# Altium footprint library Custom_Library.PcbLib: 221 footprints (part 5 of 14)
Each footprint in its own frame and in the unit in brackets; x right, y up, seen from the top. Pads: shape width x height; smd on the part's side, far side on the other; paste and mask are expansions set on the pad; w line width, h text height; cw(c..) or ccw(c..) is an arc to the next point about the centre after c.
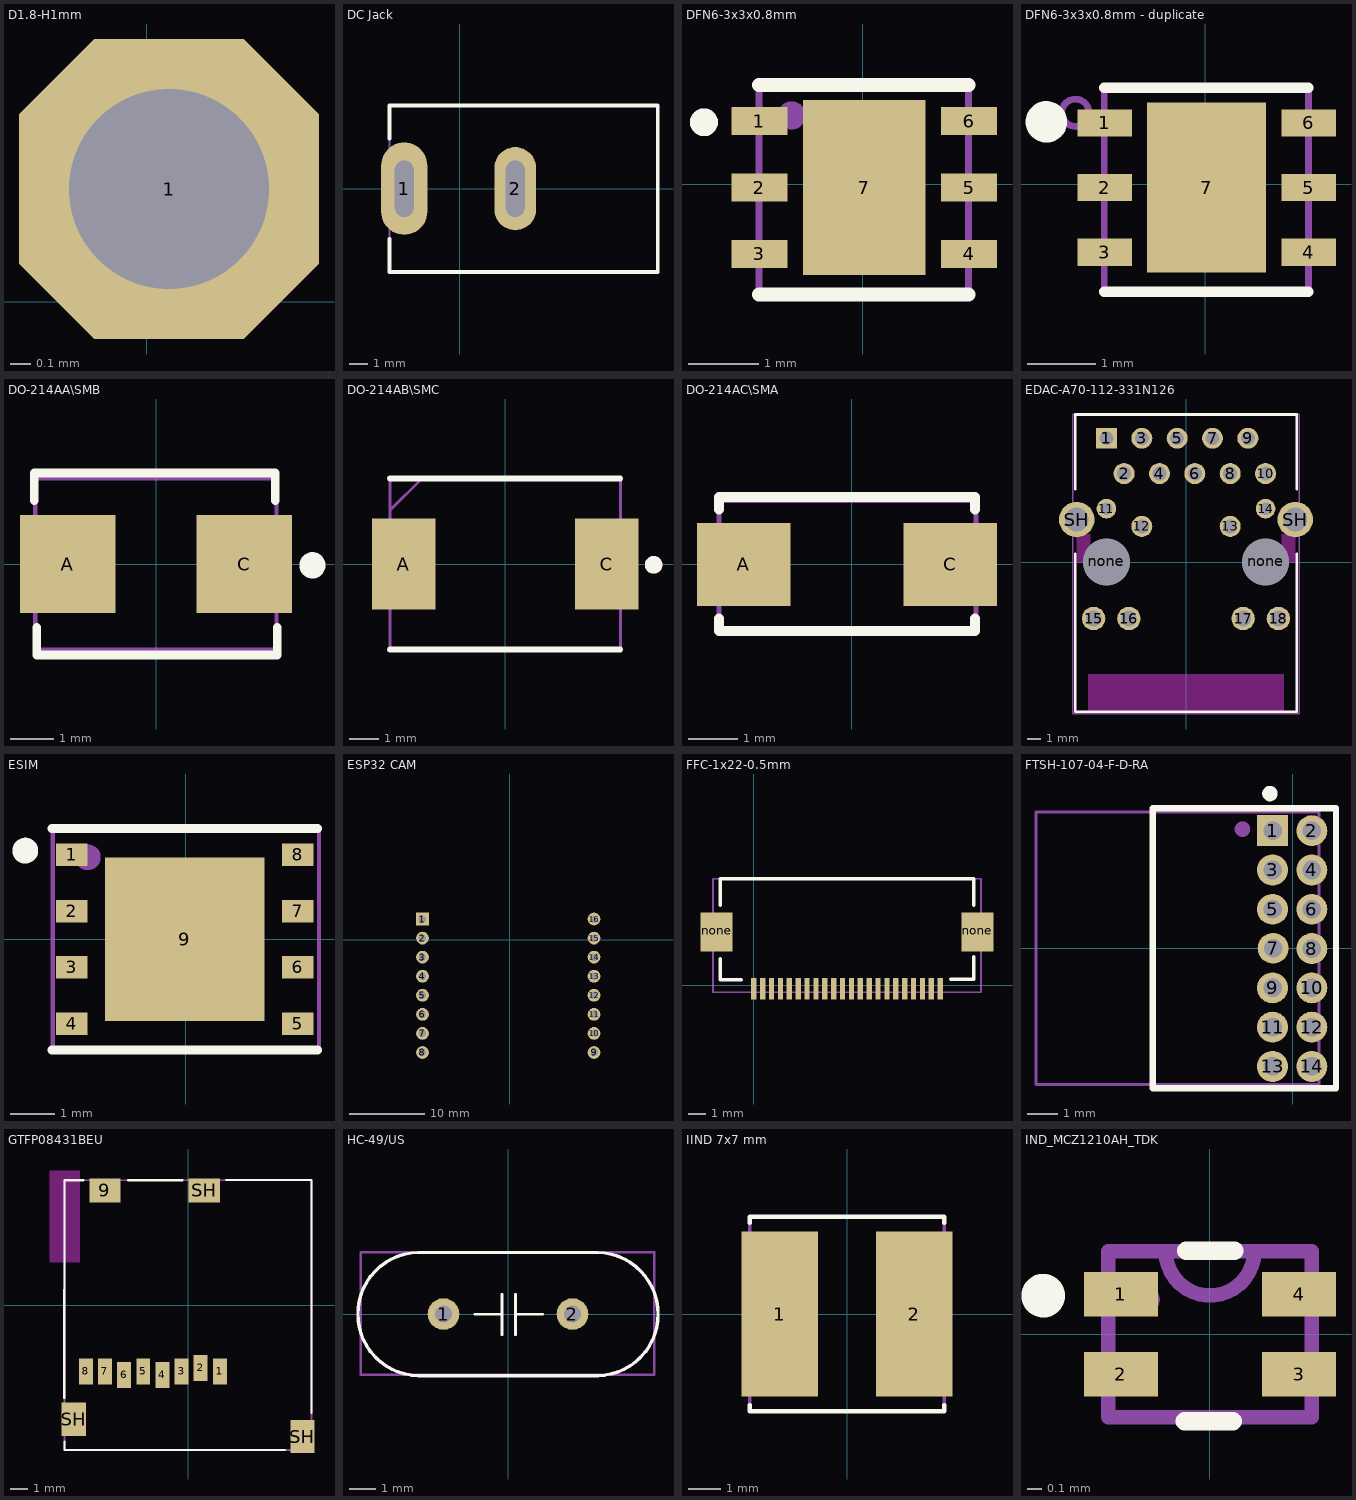
[diagram p4: the footprints below, top view; thin cyan lines are the x and y axes]

## D1.8-H1mm [mm]
height 1.3
pads (1):
  oct 1.5x1.5 hole 1 mask+0.1: 1(0.112,0.564)

## DC Jack [mm]
pads (2):
  oval 2.5x5 hole 1.016 slot 3.048 at 90 deg: 1(-3,0)
  oval 2.25x4.5 hole 1.016 slot 3.048 at 90 deg: 2(3,0)
Top Overlay:
  lines w0.2: -3.8,-2.7 -3.8,-4.5 10.7,-4.5 10.7,4.5 -3.8,4.5 -3.8,2.7
Top Assembly:
  lines w0.1: -3.8,-4.535 10.72,-4.535 10.72,4.5 -3.7,4.5 -3.8,4.5 -3.8,-4.535
  text "'.Designator'" at -0.885,-6.541 h1.27
3D body "PJ-037AH--3DModel-STEP-56544.STEP": height 11.1, standoff -3.4, extent -3.796,-4.51 10.704,4.49

## DFN6-3x3x0.8mm [mil]
pads (7):
  rect 31.5x15.75 smd mask+1.97: 1(-58.27,35.43) 2(-58.27,-1.97) 3(-58.27,-39.37) 4(59.85,-39.37) 5(59.85,-1.97) 6(59.85,35.43)
  rect 68.9x98.43 smd mask+1.97: 7(0.79,-1.97)
Top Overlay:
  circle w7.87: c-89.42,34.8 r3.94
  lines w7.87: -58.5,-62.24 59.61,-62.24 ; -58.5,55.87 59.61,55.87
Top Assembly:
  circle w7.87: c-40,38.7 r3.94
  lines w3.94: -58.5,56.26 -58.5,-61.85 ; 59.61,56.26 59.61,-61.85 ; -58.5,-61.85 -58.5,56.69 59.61,56.69 59.61,-61.85 ; -58.5,-61.85 59.61,-61.85
  text "'.Designator'" at -145.36,-112.32 h59.06
3D body "User Library-DFN6.STEP": height -16.46, standoff -47.95, extent -58.26,-61.02 59.85,57.08

## DFN6-3x3x0.8mm - duplicate [mil]
pads (7):
  rect 31.5x15.75 smd mask+1.97: 1(-58.27,35.43) 2(-58.27,-1.97) 3(-58.27,-39.37) 4(59.85,-39.37) 5(59.85,-1.97) 6(59.85,35.43)
  rect 68.9x98.43 smd mask+1.97: 7(0.79,-1.97)
Top Overlay:
  circle w12: c-91.99,36.08 r6
  lines w5.91: -58.5,-62.24 59.61,-62.24 ; -58.5,55.87 59.61,55.87
Top Assembly:
  circle w3.94: c-75.2,41.34 r7.87
  lines w3.94: -58.5,56.26 -58.5,-61.85 ; 59.61,56.26 59.61,-61.85 ; -58.5,-61.85 -58.5,56.69 59.61,56.69 59.61,-61.85 ; -58.5,-61.85 59.61,-61.85
  text "'.Designator'" at 28.47,12.06 h59.06
3D body "User Library-DFN6.STEP": height -16.46, standoff -47.95, extent -58.26,-61.03 59.85,57.08

## DO-214AA\SMB [mil]
pads (2):
  rect 87x89 smd paste+0: A(-80.5,0) C(80.5,0)
Top Overlay:
  circle w12: c142.61,-1.22 r6
  lines w7.87: -111.03,57.6 -111.03,83 108.84,83 108.84,57.6 ; -108.84,-57.6 -108.84,-83 110.48,-83 110.48,-57.6
Top Assembly:
  lines w3.94: -110.13,-78.06 109.84,-78.06 109.84,78.12 -110.13,78.12 -110.13,-78.06
  text "'.Designator'" at -140.17,-127.68 h50
3D body "SMB_STM.step": height 121.81, standoff -1.78, extent -110,-78 110,77.99

## DO-214AB\SMC [mm]
pads (2):
  rect 2.2x3.15 smd: A(-3.5,0) C(3.5,0)
Top Overlay:
  circle w0.305: c5.116,-0.029 r0.152
  lines w0.2: -3.97,-2.952 3.97,-2.952 ; -3.97,2.952 3.97,2.952
Top Assembly:
  text "'.Designator'" at -0.213,0.508 h1.27
Mechanical 15:
  lines w0.1: -3.97,1.852 -2.87,2.952 ; -3.97,-2.952 -3.97,2.952 3.97,2.952 3.97,-2.952 -3.97,-2.952
3D body "SMLJ60S6-TP.stp": height -0.83, standoff -3.33, extent -3.976,-3.073 4.024,3.027

## DO-214AC\SMA [mm]
pads (2):
  rect 1.9x1.69 smd: A(-2.195,0) C(1.995,0)
Top Overlay:
  lines w0.2: -2.7,-1.1 -2.7,-1.351 2.5,-1.351 2.5,-1.1 ; -2.698,1.119 -2.698,1.371 2.502,1.371 2.502,1.119
Top Assembly:
  lines w0.1: -2.7,-1.3 -2.7,1.3 2.522,1.3 2.522,-1.3 -2.7,-1.3
  text "'.Designator'" at -3.298,-2.833 h1.27
3D body "SMA.step": height 2.2, standoff 0, extent -2.697,-1.303 2.497,1.303

## EDAC-A70-112-331N126 [mm]
pads (22):
  rect 1.508x1.508 hole 1: 1(-5.715,8.89)
  round 1.508 hole 1: 2(-4.445,6.35) 3(-3.175,8.89) 4(-1.905,6.35) 5(-0.635,8.89) 6(0.635,6.35) 7(1.905,8.89) 8(3.175,6.35) 9(4.445,8.89) 10(5.715,6.35) 12(-3.175,2.56) 13(3.175,2.56)
  round 1.408 hole 0.9: 11(-5.715,3.83) 14(5.715,3.83)
  round 1.68 hole 1.12: 15(-6.64,-4.06) 16(-4.1,-4.06) 17(4.1,-4.06) 18(6.64,-4.06)
  round 3.35 hole 3.35 unplated: none(-5.715,0) none(5.715,0)
  round 2.55 hole 1.7: SH(-7.85,3.05) SH(7.85,3.05)
Top Overlay:
  lines w0.2: -7.95,0.6 -7.95,-10.75 7.95,-10.75 7.95,0.6 ; -7.95,5.25 -7.95,10.6 7.95,10.6 7.95,5.25
Keep-Out Layer:
  region: 7.005,-10.75 -7.005,-10.75 -7.005,-8.05 7.005,-8.05
  region: 7.005,-10.75 -7.005,-10.75 -7.005,-8.05 7.005,-8.05
  region: 7.85,0 6.875,0 6.875,2 7.85,2
  region: 7.85,0 6.875,0 6.875,2 7.85,2
  region: -6.875,0 -7.85,0 -7.85,2 -6.875,2
  region: -6.875,0 -7.85,0 -7.85,2 -6.875,2
Top Assembly:
  lines w0.1: -8.138,-10.918 -8.138,10.4 -8.138,10.632 8.12,10.632 8.12,-10.918 -8.138,-10.918
  text "'.Designator'" at -3.714,-7.772 h1.27
3D body "A70-112-331N126--3DModel-STEP-56544.STEP": height 13.65, standoff -3.3, extent -8.116,-10.906 8.084,10.594

## ESIM [mm]
pads (9):
  rect 0.71x0.51 smd: 1(-2.576,1.901) 2(-2.576,0.631) 3(-2.576,-0.639) 4(-2.576,-1.909) 5(2.524,-1.909) 6(2.524,-0.639) 7(2.524,0.631) 8(2.524,1.901)
  rect 3.6x3.7 smd paste-3: 9(-0.026,-0.004)
Top Overlay:
  circle w0.3: c-3.626,1.996 r0.141
  lines w0.2: -3.026,-2.504 2.974,-2.504 ; -3.026,2.496 2.974,2.496
Top Paste:
  region: 1.474,-1.454 0.154,-1.454 0.154,-0.184 1.474,-0.184
  region: -0.206,-1.454 -1.526,-1.454 -1.526,-0.184 -0.206,-0.184
  region: 1.474,0.176 0.154,0.176 0.154,1.446 1.474,1.446
  region: -0.206,0.176 -1.526,0.176 -1.526,1.446 -0.206,1.446
Top Assembly:
  circle w0.3: c-2.216,1.846 r0.141
  lines w0.1: -3.001,-2.511 3.004,-2.511 3.004,1.383 3.004,2.513 -3.001,2.513 -3.001,-2.511
  text "'.Designator'" at -5.023,-4.444 h2
3D body "SIM-ST-MFF2--3DModel-STEP-56544.STEP": height 0.82, standoff 0, extent -3,-2.5 3,2.5

## ESP32 CAM [mm]
pads (16):
  rect 1.7x1.7 hole 1 mask+0.05: 1(-11.623,2.78)
  round 1.7 hole 1 mask+0.05: 2(-11.623,0.24) 3(-11.623,-2.3) 4(-11.623,-4.84) 5(-11.623,-7.38) 6(-11.623,-9.92) 7(-11.623,-12.46) 8(-11.623,-15) 9(11.237,-15) 10(11.237,-12.46) 11(11.237,-9.92) 12(11.237,-7.38) 13(11.237,-4.84) 14(11.237,-2.3) 15(11.237,0.24) 16(11.237,2.78)
Bottom Overlay:
  circle w0.2: c-13.972,2.975 r0.1
  lines w0.127: -13.605,-19.867 -13.605,20.107 13.617,20.107 13.617,-19.867 -13.605,-19.867
3D body "esp32cam.STEP": height 5.05, standoff -12.15, extent -13.6,-19.878 13.6,20.122

## FFC-1x22-0.5mm [mm]
pads (24):
  rect 0.3x1.2 smd: 1(0,-0.2) 2(0.5,-0.2) 3(1,-0.2) 4(1.5,-0.2) 5(2,-0.2) 6(2.5,-0.2) 7(3,-0.2) 8(3.5,-0.2) 9(4,-0.2) 10(4.5,-0.2) 11(5,-0.2) 12(5.5,-0.2) 13(6,-0.2) 14(6.5,-0.2) 15(7,-0.2) 16(7.5,-0.2) 17(8,-0.2) 18(8.5,-0.2) 19(9,-0.2) 20(9.5,-0.2) 21(10,-0.2) 22(10.5,-0.2)
  rect 1.8x2.2 smd: none(-2.1,3) none(12.6,3)
Top Overlay:
  lines w0.2: -1.9,1.5 -1.9,0.3 -0.7,0.3 ; -1.9,4.5 -1.9,6 12.4,6 12.4,4.5 ; 11.1,0.34 12.4,0.34 12.4,1.6
Top Assembly:
  lines w0.1: -2.3,-0.4 12.8,-0.4 12.8,6 -1.1,6 -2.3,6 -2.3,-0.4
  text "'.Designator'" at 0.03,2.234 h2
3D body "FH12-22S-0.5SH.STEP": height -0.44, standoff -2.54, extent -2.291,-0.401 12.809,5.999

## FTSH-107-04-F-D-RA [mm] "1.27mm pitch, 14 pin, interconnect strip; double row"
height 3.05
pads (14):
  rect 1x1 / inner round 1 / far side rect 1x1 hole 0.6: 1(-0.655,3.8)
  round 1 hole 0.6: 2(0.615,3.8) 3(-0.655,2.53) 4(0.615,2.53) 5(-0.655,1.26) 6(0.615,1.26) 7(-0.635,0) 8(0.615,-0.01) 9(-0.655,-1.28) 10(0.615,-1.28) 11(-0.655,-2.55) 12(0.615,-2.55) 13(-0.655,-3.82) 14(0.615,-3.82)
Top Overlay:
  circle w0.25: c-0.74,5 r0.125
  lines w0.2: -4.527,-4.527 -4.527,4.527 1.396,4.527 1.396,-4.527 -4.527,-4.527
Top Assembly:
  circle w0.25: c-1.628,3.85 r0.125
  lines w0.1: -8.3,-4.4 -5.6,-4.4 0.848,-4.4 0.848,-3.047 0.848,4.4 -8.3,4.4 -8.3,-4.4
  text "'.Designator'" at -7.135,-5.813 h1.27
3D body "FTSH-107-04-F-D-RA.STEP": height 3.61, standoff -2.1, extent -8.253,-4.408 0.815,4.405

## GTFP08431BEU [mm]
pads (12):
  rect 0.8x1.5 smd: 1(1.8,-3.8) 2(0.7,-3.6) 3(-0.4,-3.8) 4(-1.5,-4) 5(-2.6,-3.8) 6(-3.7,-4) 7(-4.8,-3.8) 8(-5.9,-3.8)
  rect 1.8x1.4 smd: 9(-4.8,6.6) SH(0.9,6.6)
  rect 1.4x1.9 smd: SH(-6.6,-6.55) SH(6.55,-7.55)
Top Layer keep-out:
  region: -6.222,2.459 -6.222,7.742 -7.975,7.742 -7.975,2.459
Top Overlay:
  lines w0.127: -7.139,-5.325 -7.132,7.182 -6.032,7.182 ; -7.132,-7.838 -7.132,-8.318 -7.125,-8.318 5.536,-8.318 ; -3.473,7.182 -0.363,7.182 ; 2.168,7.196 7.065,7.196 7.065,-6.175
Top Assembly:
  lines w0.1: -7.132,-8.318 7.068,-8.318 7.068,7.182 -6.032,7.182 -7.132,7.182 -7.132,-8.318
  text "'.Designator'" at -4.038,-0.893 h1.5
3D body "DM3CS-SF.STEP": height 1.98, standoff 0.05, extent -6.932,-7.318 6.868,6.782

## HC-49/US [mm]
pads (2):
  round 1.2 hole 0.63: 1(-2.44,0) 2(2.44,0)
Top Overlay:
  lines w0.1: -1.246,-0.014 -0.225,-0.014 ; -0.225,-0.78 -0.225,0.752 ; 0.286,-0.779 0.286,0.754 ; 0.286,-0.013 1.308,-0.013
  lines w0.127: -5.675,-0.021 cw(c-3.365,0.019) -3.405,2.329 ; -5.675,0.019 ccw(c-3.366,-0.021) -3.406,-2.33 ; -3.366,-2.33 3.372,-2.33 ; -3.365,2.33 3.359,2.33 ; 3.4,2.33 cw(c3.359,0.014) 5.675,-0.026 ; 3.412,-2.329 ccw(c3.372,-0.026) 5.675,0.014
Top Assembly:
  lines w0.1: -5.571,-2.299 -5.571,2.332 5.527,2.332 5.527,-2.299 -5.571,-2.299
  text "'.Designator'" at -3.499,-3.708 h1.27
3D body "CRYSTAL_192MIL.STEP": height 3.5, standoff -1.3, extent -5.525,-2.299 5.525,2.351

## IIND 7x7 mm [mm]
pads (2):
  rect 2.35x5.1 smd: 1(-2.075,0) 2(2.075,0)
Top Overlay:
  lines w0.127: -3,-2.8 -3,-3 3,-3 3,-2.8 ; -3,2.8 -3,3 3,3 3,2.8
Top Assembly:
  lines w0.1: -3,-3 -3,3 0.3,3 3,3 3,-3 -3,-3
  text "'.Designator'" at -3.409,-4.331 h1.27
3D body: height 4.5, standoff 0, extent -3,-3 3,3

## IND_MCZ1210AH_TDK [mil]
pads (4):
  rect 20x12 smd: 1(-24.11,10.83) 2(-24.11,-10.83) 3(24.11,-10.83) 4(24.11,10.83)
Top Overlay:
  circle w7.87: c-45.12,10.46 r1.97
  lines w5: -6.83,-23.49 6.21,-23.49 ; -6.4,22.59 6.64,22.59
Top Assembly:
  circle w1.97: c-17.56,9.39 r3
  lines w3.94: -12,22.5 ccw(c0,22.5) 12,22.5 ; -27.5,-22.5 -27.5,22.5 27.5,22.5 27.5,-22.5 -27.5,-22.5
  text "'.Designator'" at -126.19,-60.94 h50
3D body: height 23.62, standoff 0, extent -27.5,-22.5 27.5,22.5